# Altium footprint library THD Connectors-2.PcbLib: 84 footprints (part 4 of 6)
Each footprint in its own frame and in the unit in brackets; x right, y up, seen from the top. Pads: shape width x height; smd on the part's side, far side on the other; paste and mask are expansions set on the pad; w line width, h text height; cw(c..) or ccw(c..) is an arc to the next point about the centre after c.
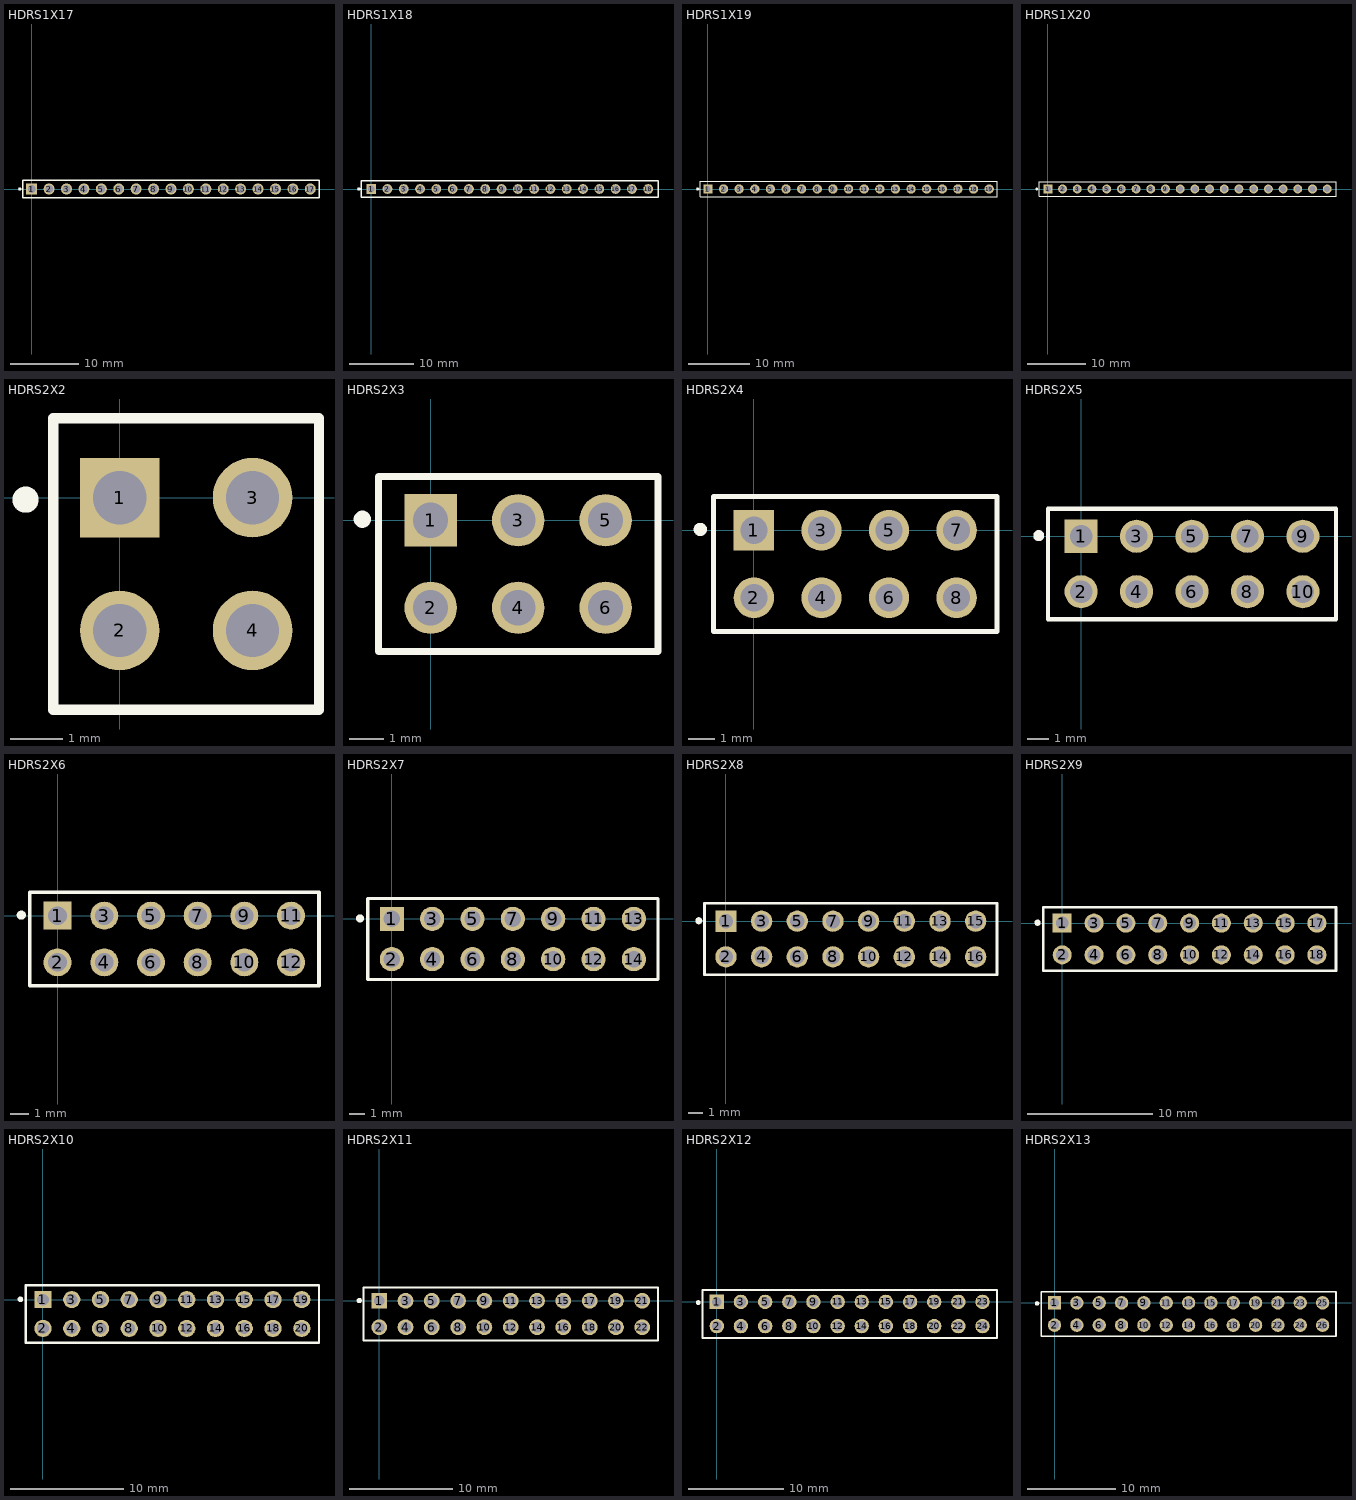
[diagram p3: the footprints below, top view; thin cyan lines are the x and y axes]

## HDRS1X17 [mm] "Connector; Socket Header; 17 Position"
height 8.54
pads (17):
  rect 1.6x1.6 hole 1.1: 1(0,0)
  round 1.6 hole 1.1: 2(2.54,0) 3(5.08,0) 4(7.62,0) 5(10.16,0) 6(12.7,0) 7(15.24,0) 8(17.78,0) 9(20.32,0) 10(22.86,0) 11(25.4,0) 12(27.94,0) 13(30.48,0) 14(33.02,0) 15(35.56,0) 16(38.1,0) 17(40.64,0)
Top Overlay:
  circle w0.25: c-1.725,0 r0.125
  lines w0.2: -1.27,-1.27 -1.27,1.27 0.635,1.27 41.91,1.27 41.91,-1.27 -1.27,-1.27
3D body "61300211821.stp": height 8.51, standoff -3.09, extent 36.58,-1.25 42.16,1.25
3D body "61301511821.stp": height 8.51, standoff -3.09, extent -1.524,-1.25 36.576,1.25

## HDRS1X18 [mm] "Connector; Socket Header; 18 Position"
height 8.5
pads (18):
  rect 1.52x1.52 hole 1.02: 1(0,0)
  round 1.52 hole 1.02: 2(2.54,0) 3(5.08,0) 4(7.62,0) 5(10.16,0) 6(12.7,0) 7(15.24,0) 8(17.78,0) 9(20.32,0) 10(22.86,0) 11(25.4,0) 12(27.94,0) 13(30.48,0) 14(33.02,0) 15(35.56,0) 16(38.1,0) 17(40.64,0) 18(43.18,0)
Top Overlay:
  circle w0.25: c-1.925,0 r0.125
  lines w0.2: -1.52,-1.27 44.7,-1.27 44.7,1.27 0.635,1.27 -1.52,1.27 -1.52,-1.27
3D body "61301811821.stp": height 8.51, standoff -3.09, extent -1.52,-1.25 44.7,1.25

## HDRS1X19 [mm] "Connector; Socket Header; 19 Position"
pads (19):
  rect 1.5x1.5 hole 0.9: 1(0,0)
  round 1.5 hole 0.9: 2(2.54,0) 3(5.08,0) 4(7.62,0) 5(10.16,0) 6(12.7,0) 7(15.24,0) 8(17.78,0) 9(20.32,0) 10(22.86,0) 11(25.4,0) 12(27.94,0) 13(30.48,0) 14(33.02,0) 15(35.56,0) 16(38.1,0) 17(40.64,0) 18(43.18,0) 19(45.72,0)
Top Overlay:
  circle w0.25: c-1.649,0 r0.125
  lines w0.2: -1.27,-1.27 46.99,-1.27 46.99,1.27 0.635,1.27 -1.27,1.27 -1.27,-1.27
3D body "61301511821.stp": height 8.51, standoff -3.09, extent -1.524,-1.23 36.576,1.27
3D body "61300411821.stp": height 8.51, standoff -3.09, extent 36.453,-1.25 47.113,1.25

## HDRS1X20 [mm] "Connector; Socket Header; 20 Position"
height 8.5
pads (20):
  rect 1.52x1.52 hole 1.02: 1(0,0)
  round 1.52 hole 1.02: 2(2.54,0) 3(5.08,0) 4(7.62,0) 5(10.16,0) 6(12.7,0) 7(15.24,0) 8(17.78,0) 9(20.32,0) 10(22.86,0) 11(25.4,0) 12(27.94,0) 13(30.48,0) 14(33.02,0) 15(35.56,0) 16(38.1,0) 17(40.64,0) 18(43.18,0) 19(45.72,0) 20(48.26,0)
Top Overlay:
  circle w0.25: c-1.925,0 r0.125
  lines w0.2: -1.52,-1.27 -1.52,1.27 0.635,1.27 49.78,1.27 49.78,-1.27 -1.52,-1.27
3D body "61302011821.stp": height 8.51, standoff -3.09, extent -1.52,-1.25 49.78,1.25

## HDRS2X2 [mm] "Connector; Socket Header; 2x2 Position"
height 8.5
pads (4):
  rect 1.52x1.52 hole 1.02: 1(0,0)
  round 1.52 hole 1.02: 2(0,-2.54) 3(2.54,0) 4(2.54,-2.54)
Top Overlay:
  circle w0.25: c-1.8,-0.04 r0.125
  lines w0.2: -1.27,-4.06 3.81,-4.06 3.81,1.52 -1.27,1.52 -1.27,-4.06
3D body "61300421821.stp": height 8.51, standoff -3.09, extent -1.27,-4.06 3.81,1.52

## HDRS2X3 [mm] "Connector; Socket Header; 2x3 Position"
height 8.5
pads (6):
  rect 1.52x1.52 hole 1.02: 1(0,0)
  round 1.52 hole 1.02: 2(0,-2.54) 3(2.54,0) 4(2.54,-2.54) 5(5.08,0) 6(5.08,-2.54)
Top Overlay:
  circle w0.25: c-1.985,0.03 r0.125
  lines w0.2: -1.52,-3.81 6.6,-3.81 6.6,1.27 -1.52,1.27 -1.52,-3.81
3D body "61300621821.stp": height 8.51, standoff -3.09, extent -1.52,-3.81 6.6,1.27

## HDRS2X4 [mm] "Connector; Socket Header; 2x4 Position"
height 8.5
pads (8):
  rect 1.52x1.52 hole 1.02: 1(0,0)
  round 1.52 hole 1.02: 2(0,-2.54) 3(2.54,0) 4(2.54,-2.54) 5(5.08,0) 6(5.08,-2.54) 7(7.62,0) 8(7.62,-2.54)
Top Overlay:
  circle w0.25: c-2.015,0.03 r0.125
  lines w0.2: -1.52,-3.81 -1.52,1.27 9.14,1.27 9.14,-3.81 -1.52,-3.81
3D body "61300821821.stp": height 8.51, standoff -3.09, extent -1.52,-3.81 9.14,1.27

## HDRS2X5 [mm] "Connector; Socket Header; 2x5 Position"
height 8.5
pads (10):
  rect 1.52x1.52 hole 1.02: 1(0,0)
  round 1.52 hole 1.02: 2(0,-2.54) 3(2.54,0) 4(2.54,-2.54) 5(5.08,0) 6(5.08,-2.54) 7(7.62,0) 8(7.62,-2.54) 9(10.16,0) 10(10.16,-2.54)
Top Overlay:
  circle w0.25: c-1.945,0.03 r0.125
  lines w0.2: -1.52,-3.81 3.81,-3.81 11.68,-3.81 11.68,1.27 -1.52,1.27 -1.52,-3.81
3D body "61301021821.stp": height 8.51, standoff -3.09, extent -1.52,-3.81 11.68,1.27

## HDRS2X6 [mm] "Connector; Socket Header; 2x6 Position"
height 8.5
pads (12):
  rect 1.52x1.52 hole 1.02: 1(0,0)
  round 1.52 hole 1.02: 2(0,-2.54) 3(2.54,0) 4(2.54,-2.54) 5(5.08,0) 6(5.08,-2.54) 7(7.62,0) 8(7.62,-2.54) 9(10.16,0) 10(10.16,-2.54) 11(12.7,0) 12(12.7,-2.54)
Top Overlay:
  circle w0.25: c-1.975,0.03 r0.125
  lines w0.2: -1.52,-3.81 14.22,-3.81 14.22,1.27 -1.52,1.27 -1.52,-3.81
3D body "61301221821.stp": height 8.51, standoff -3.09, extent -1.52,-3.81 14.22,1.27

## HDRS2X7 [mm] "Connector; Socket Header; 2x7 Position"
height 8.5
pads (14):
  rect 1.52x1.52 hole 1.02: 1(0,0)
  round 1.52 hole 1.02: 2(0,-2.54) 3(2.54,0) 4(2.54,-2.54) 5(5.08,0) 6(5.08,-2.54) 7(7.62,0) 8(7.62,-2.54) 9(10.16,0) 10(10.16,-2.54) 11(12.7,0) 12(12.7,-2.54) 13(15.24,0) 14(15.24,-2.54)
Top Overlay:
  circle w0.25: c-2.005,0.03 r0.125
  lines w0.2: -1.52,-3.81 16.76,-3.81 16.76,1.27 -1.52,1.27 -1.52,-3.81
3D body "61301421821.stp": height 8.51, standoff -3.09, extent -1.52,-3.81 16.76,1.27

## HDRS2X8 [mm] "Connector; Socket Header; 2x8 Position"
height 8.5
pads (16):
  rect 1.52x1.52 hole 1.02: 1(0,0)
  round 1.52 hole 1.02: 2(0,-2.54) 3(2.54,0) 4(2.54,-2.54) 5(5.08,0) 6(5.08,-2.54) 7(7.62,0) 8(7.62,-2.54) 9(10.16,0) 10(10.16,-2.54) 11(12.7,0) 12(12.7,-2.54) 13(15.24,0) 14(15.24,-2.54) 15(17.78,0) 16(17.78,-2.54)
Top Overlay:
  circle w0.25: c-1.935,0.03 r0.125
  lines w0.2: -1.52,-3.81 -1.52,1.27 19.3,1.27 19.3,-3.81 -1.52,-3.81
3D body "61301621821.stp": height 8.51, standoff -3.09, extent -1.52,-3.81 19.3,1.27

## HDRS2X9 [mm] "Connector; Socket Header; 2x9 Position"
height 8.5
pads (18):
  rect 1.52x1.52 hole 1.02: 1(0,0)
  round 1.52 hole 1.02: 2(0,-2.54) 3(2.54,0) 4(2.54,-2.54) 5(5.08,0) 6(5.08,-2.54) 7(7.62,0) 8(7.62,-2.54) 9(10.16,0) 10(10.16,-2.54) 11(12.7,0) 12(12.7,-2.54) 13(15.24,0) 14(15.24,-2.54) 15(17.78,0) 16(17.78,-2.54) 17(20.32,0) 18(20.32,-2.54)
Top Overlay:
  circle w0.25: c-1.965,0.03 r0.125
  lines w0.2: -1.52,-3.81 21.84,-3.81 21.84,1.27 -1.52,1.27 -1.52,-3.81
3D body "61301821821.stp": height 8.51, standoff -3.09, extent -1.52,-3.81 21.84,1.27

## HDRS2X10 [mm] "Connector; Socket Header; 2x10 Position"
height 8.5
pads (20):
  rect 1.52x1.52 hole 1.02: 1(0,0)
  round 1.52 hole 1.02: 2(0,-2.54) 3(2.54,0) 4(2.54,-2.54) 5(5.08,0) 6(5.08,-2.54) 7(7.62,0) 8(7.62,-2.54) 9(10.16,0) 10(10.16,-2.54) 11(12.7,0) 12(12.7,-2.54) 13(15.24,0) 14(15.24,-2.54) 15(17.78,0) 16(17.78,-2.54) 17(20.32,0) 18(20.32,-2.54) 19(22.86,0) 20(22.86,-2.54)
Top Overlay:
  circle w0.25: c-1.995,0.03 r0.125
  lines w0.2: -1.52,-3.81 24.38,-3.81 24.38,1.27 -1.52,1.27 -1.52,-3.81
3D body "61302021821.stp": height 8.51, standoff -3.09, extent -1.52,-3.81 24.38,1.27

## HDRS2X11 [mm] "Connector; Socket Header; 2x11 Position"
height 8.5
pads (22):
  rect 1.52x1.52 hole 1.02: 1(0,0)
  round 1.52 hole 1.02: 2(0,-2.54) 3(2.54,0) 4(2.54,-2.54) 5(5.08,0) 6(5.08,-2.54) 7(7.62,0) 8(7.62,-2.54) 9(10.16,0) 10(10.16,-2.54) 11(12.7,0) 12(12.7,-2.54) 13(15.24,0) 14(15.24,-2.54) 15(17.78,0) 16(17.78,-2.54) 17(20.32,0) 18(20.32,-2.54) 19(22.86,0) 20(22.86,-2.54) 21(25.4,0) 22(25.4,-2.54)
Top Overlay:
  circle w0.25: c-1.925,0.03 r0.125
  lines w0.2: -1.52,-3.81 26.92,-3.81 26.92,1.27 -1.52,1.27 -1.52,-3.81
3D body "61302221821.stp": height 8.51, standoff -3.09, extent -1.52,-3.81 26.92,1.27

## HDRS2X12 [mm] "Connector; Socket Header; 2x12 Position"
height 8.5
pads (24):
  rect 1.52x1.52 hole 1.02: 1(0,0)
  round 1.52 hole 1.02: 2(0,-2.54) 3(2.54,0) 4(2.54,-2.54) 5(5.08,0) 6(5.08,-2.54) 7(7.62,0) 8(7.62,-2.54) 9(10.16,0) 10(10.16,-2.54) 11(12.7,0) 12(12.7,-2.54) 13(15.24,0) 14(15.24,-2.54) 15(17.78,0) 16(17.78,-2.54) 17(20.32,0) 18(20.32,-2.54) 19(22.86,0) 20(22.86,-2.54) 21(25.4,0) 22(25.4,-2.54) 23(27.94,0) 24(27.94,-2.54)
Top Overlay:
  circle w0.25: c-1.955,-0.07 r0.125
  lines w0.2: -1.52,-3.81 29.46,-3.81 29.46,1.27 -1.52,1.27 -1.52,-3.81
3D body "61302421821.stp": height 8.51, standoff -3.09, extent -1.52,-3.81 29.46,1.27

## HDRS2X13 [mm] "Connector; Socket Header; 2x13 Position"
height 8.5
pads (26):
  rect 1.52x1.52 hole 1.02: 1(0,0)
  round 1.52 hole 1.02: 2(0,-2.54) 3(2.54,0) 4(2.54,-2.54) 5(5.08,0) 6(5.08,-2.54) 7(7.62,0) 8(7.62,-2.54) 9(10.16,0) 10(10.16,-2.54) 11(12.7,0) 12(12.7,-2.54) 13(15.24,0) 14(15.24,-2.54) 15(17.78,0) 16(17.78,-2.54) 17(20.32,0) 18(20.32,-2.54) 19(22.86,0) 20(22.86,-2.54) 21(25.4,0) 22(25.4,-2.54) 23(27.94,0) 24(27.94,-2.54) 25(30.48,0) 26(30.48,-2.54)
Top Overlay:
  circle w0.25: c-1.985,-0.07 r0.125
  lines w0.2: 32,-3.81 32,1.27 ; 32.004,-3.81 -1.52,-3.81 -1.52,1.27 32.004,1.27
3D body "61302621821.stp": height 8.51, standoff -3.09, extent -1.524,-3.81 31.496,1.27